# Altium footprint library Modules.PcbLib: 6 footprints (part 5 of 6)
Each footprint in its own frame and in the unit in brackets; x right, y up, seen from the top. Pads: shape width x height; smd on the part's side, far side on the other; paste and mask are expansions set on the pad; w line width, h text height; cw(c..) or ccw(c..) is an arc to the next point about the centre after c.
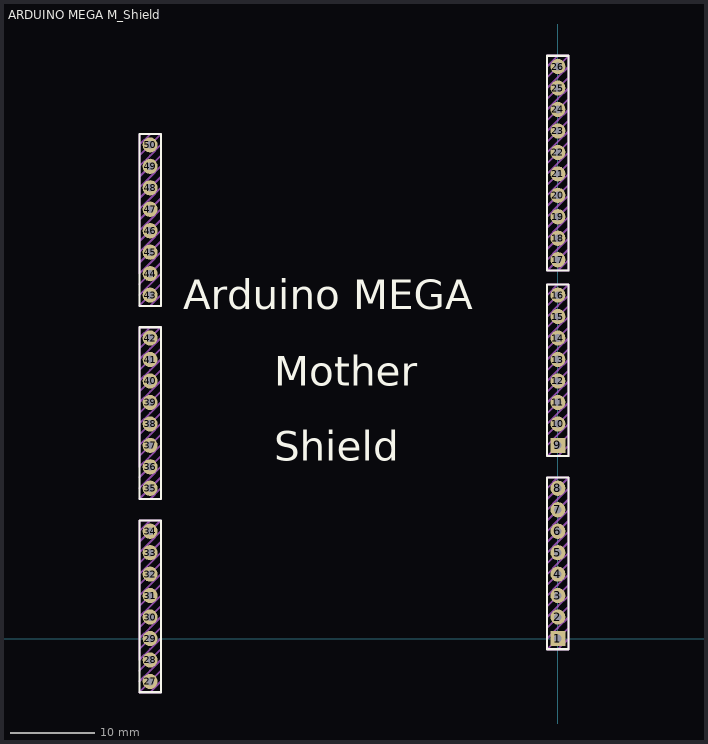
[diagram p4: the footprint, top view; thin cyan lines are the x and y axes]

## ARDUINO MEGA M_Shield [mm] "ARDUINO MEGA 2560 Full Mother Shield"
pads (50):
  rect 1.8x1.8 hole 0.9: 1(0,0) 9(0,22.86)
  round 1.8 hole 0.9: 2(0,2.54) 3(0,5.08) 4(0,7.62) 5(0,10.16) 6(0,12.7) 7(0,15.24) 8(0,17.78) 10(0,25.4) 11(0,27.94) 12(0,30.48) 13(0,33.02) 14(0,35.56) 15(0,38.1) 16(0,40.64) 17(0,44.831) 18(0,47.371) 19(0,49.911) 20(0,52.451) 21(0,54.991) 22(0,57.531) 23(0,60.071) 24(0,62.611) 25(0,65.151) 26(0,67.691) 27(-48.26,-5.08) 28(-48.26,-2.54) 29(-48.26,0) 30(-48.26,2.54) 31(-48.26,5.08) 32(-48.26,7.62) 33(-48.26,10.16) 34(-48.26,12.7) 35(-48.26,17.78) 36(-48.26,20.32) 37(-48.26,22.86) 38(-48.26,25.4) 39(-48.26,27.94) 40(-48.26,30.48) 41(-48.26,33.02) 42(-48.26,35.56) 43(-48.26,40.64) 44(-48.26,43.18) 45(-48.26,45.72) 46(-48.26,48.26) 47(-48.26,50.8) 48(-48.26,53.34) 49(-48.26,55.88) 50(-48.26,58.42)
Top Overlay:
  drawing of 313 lines, arcs and shapes, not listed
  text "Mother" at -33.59,29.91 h3.5
  text "Shield" at -33.59,21.02 h3.5
  text "Arduino MEGA" at -44.323,38.989 h3.5
Draw:
  drawing of 261 lines, arcs and shapes, not listed
3D body: height 8, standoff 0, extent -1.27,46.101 -0.991,48.641
3D body: height 8, standoff 0, extent -1.27,48.641 -0.991,51.181
3D body: height 8, standoff 0, extent -1.27,43.561 -0.991,46.101
3D body: height 8, standoff 0, extent -1.27,51.181 -0.991,53.721
3D body: height 8, standoff 0, extent -1.27,53.721 -0.991,56.261
3D body: height 8, standoff 7.5, extent -1.008,43.815 -0.508,45.847
3D body: height 8, standoff 7.5, extent -1.008,48.895 -0.508,50.927
3D body: height 8, standoff 7.5, extent -1.008,46.355 -0.508,48.387
3D body: height 8, standoff 7.5, extent -1.008,51.435 -0.508,53.467
3D body: height 8, standoff 7.5, extent -1.008,53.975 -0.508,56.007
3D body: height 7.5, standoff 0, extent -0.533,44.298 -0.508,45.365
3D body: height 7.5, standoff 0, extent -0.533,49.378 -0.508,50.445
3D body: height 7.5, standoff 0, extent -0.533,46.838 -0.508,47.905
3D body: height 7.5, standoff 0, extent -0.533,51.918 -0.508,52.985
3D body: height 7, standoff 0, extent -0.534,49.378 -0.483,50.445
3D body: height 7, standoff 0, extent -0.534,44.298 -0.483,45.365
3D body: height 7, standoff 0, extent -0.534,54.458 -0.483,55.525
3D body: height 7, standoff 0, extent -0.534,46.838 -0.483,47.905
3D body: height 7, standoff 0, extent -0.534,51.918 -0.483,52.985
3D body: height 7, standoff 0, extent -0.534,45.314 0.533,45.365
3D body: height 7, standoff 0, extent -0.534,50.394 0.533,50.445
3D body: height 7, standoff 0, extent -0.534,47.854 0.533,47.905
3D body: height 7, standoff 0, extent -0.534,52.934 0.533,52.985
3D body: height 7, standoff 0, extent -0.534,49.378 0.533,49.429
3D body: height 7, standoff 0, extent -0.534,44.298 0.533,44.349
3D body: height 7, standoff 0, extent -0.534,46.838 0.533,46.889
3D body: height 7, standoff 0, extent -0.534,51.918 0.533,51.969
3D body: height 7, standoff 0, extent -0.534,54.458 0.533,54.509
3D body: height 8, standoff 0, extent -1.27,56.261 -0.991,58.801
3D body: height 8, standoff 0, extent -1.27,58.801 -0.991,61.341
3D body: height 8, standoff 0, extent -1.27,61.341 -0.991,63.881
3D body: height 8, standoff 0, extent -1.27,63.881 -0.991,66.421
3D body: height 8, standoff 0, extent -1.27,66.421 -0.991,68.961
3D body: height 8, standoff 7.5, extent -1.008,56.515 -0.508,58.547
3D body: height 8, standoff 7.5, extent -1.008,61.595 -0.508,63.627
3D body: height 8, standoff 7.5, extent -1.008,64.135 -0.508,66.167
3D body: height 8, standoff 7.5, extent -1.008,59.055 -0.508,61.087
3D body: height 8, standoff 7.5, extent -1.008,66.675 -0.508,68.707
3D body: height 7.5, standoff 0, extent -0.533,54.458 -0.508,55.525
3D body: height 7.5, standoff 0, extent -0.533,59.538 -0.508,60.605
3D body: height 7.5, standoff 0, extent -0.533,56.998 -0.508,58.065
3D body: height 7.5, standoff 0, extent -0.533,62.078 -0.508,63.145
3D body: height 7.5, standoff 0, extent -0.533,64.618 -0.508,65.685
3D body: height 7.5, standoff 0, extent -0.533,67.158 -0.508,68.225
3D body: height 7, standoff 0, extent -0.534,59.538 -0.483,60.605
3D body: height 7, standoff 0, extent -0.534,56.998 -0.483,58.065
3D body: height 7, standoff 0, extent -0.534,64.618 -0.483,65.685
3D body: height 7, standoff 0, extent -0.534,62.078 -0.483,63.145
3D body: height 7, standoff 0, extent -0.534,67.158 -0.483,68.225
3D body: height 7, standoff 0, extent -0.534,55.474 0.533,55.525
3D body: height 7, standoff 0, extent -0.534,60.554 0.533,60.605
3D body: height 7, standoff 0, extent -0.534,58.014 0.533,58.065
3D body: height 7, standoff 0, extent -0.534,63.094 0.533,63.145
3D body: height 7, standoff 0, extent -0.534,65.634 0.533,65.685
3D body: height 7, standoff 0, extent -0.534,68.174 0.533,68.225
3D body: height 7, standoff 0, extent -0.534,56.998 0.533,57.049
3D body: height 7, standoff 0, extent -0.534,59.538 0.533,59.589
3D body: height 7, standoff 0, extent -0.534,62.078 0.533,62.129
3D body: height 7, standoff 0, extent -0.534,64.618 0.533,64.669
3D body: height 7, standoff 0, extent -0.534,67.158 0.533,67.209
3D body: height 1, standoff 0, extent -0.635,49.276 0.635,50.546
3D body: height 0, standoff -2.03, extent -0.127,49.657 0.127,50.165
3D body: height 0, standoff -2.03, extent -0.127,47.117 0.127,47.625
3D body: height 1, standoff 0, extent -0.635,46.736 0.635,48.006
3D body: height 0, standoff -2.03, extent -0.127,44.577 0.127,45.085
3D body: height 1, standoff 0, extent -0.635,44.196 0.635,45.466
3D body: height 0, standoff -2.03, extent -0.127,52.197 0.127,52.705
3D body: height 1, standoff 0, extent -0.635,51.816 0.635,53.086
3D body: height 1, standoff 0, extent -0.635,54.356 0.635,55.626
3D body: height 0, standoff -2.03, extent -0.127,54.737 0.127,55.245
3D body: height 7.5, standoff 0, extent -0.533,44.298 0.533,44.323
3D body: height 7.5, standoff 0, extent -0.533,49.378 0.533,49.403
3D body: height 7.5, standoff 0, extent -0.533,54.458 0.533,54.483
3D body: height 7.5, standoff 0, extent -0.533,46.838 0.533,46.863
3D body: height 8, standoff 7.5, extent -0.991,43.823 1.041,44.323
3D body: height 7, standoff 0, extent 0.482,44.298 0.533,45.365
3D body: height 7.5, standoff 0, extent -0.533,45.339 0.533,45.365
3D body: height 7.5, standoff 0, extent 0.508,44.298 0.533,45.365
3D body: height 8, standoff 0, extent 0.991,43.561 1.27,46.101
3D body: height 8, standoff 7.5, extent 0.508,43.815 1.008,45.847
3D body: height 8, standoff 7.5, extent -0.991,46.363 1.041,46.863
3D body: height 7, standoff 0, extent 0.482,46.838 0.533,47.905
3D body: height 7.5, standoff 0, extent 0.508,46.838 0.533,47.905
3D body: height 7.5, standoff 0, extent -0.533,47.879 0.533,47.905
3D body: height 8, standoff 7.5, extent -0.991,48.903 1.041,49.403
3D body: height 7, standoff 0, extent 0.482,49.378 0.533,50.445
3D body: height 7.5, standoff 0, extent -0.533,50.419 0.533,50.445
3D body: height 8, standoff 7.5, extent -0.991,51.443 1.041,51.943
3D body: height 7, standoff 0, extent 0.482,51.918 0.533,52.985
3D body: height 7.5, standoff 0, extent 0.508,51.918 0.533,52.985
3D body: height 7.5, standoff 0, extent -0.533,52.959 0.533,52.985
3D body: height 8, standoff 7.5, extent -0.991,53.983 1.041,54.483
3D body: height 7, standoff 0, extent 0.482,54.458 0.533,55.525
3D body: height 7.5, standoff 0, extent -0.533,55.499 0.533,55.525
3D body: height 8, standoff 7.5, extent -0.991,56.523 1.041,57.023
3D body: height 7, standoff 0, extent 0.482,56.998 0.533,58.065
3D body: height 7.5, standoff 0, extent -0.533,58.039 0.533,58.065
3D body: height 8, standoff 7.5, extent -0.991,59.063 1.041,59.563
3D body: height 7, standoff 0, extent 0.482,59.538 0.533,60.605
3D body: height 7.5, standoff 0, extent 0.508,59.538 0.533,60.605
3D body: height 7.5, standoff 0, extent -0.533,60.579 0.533,60.605
3D body: height 8, standoff 7.5, extent -0.991,61.603 1.041,62.103
3D body: height 7, standoff 0, extent 0.482,62.078 0.533,63.145
3D body: height 7.5, standoff 0, extent 0.508,62.078 0.533,63.145
3D body: height 7.5, standoff 0, extent -0.533,63.119 0.533,63.145
3D body: height 8, standoff 7.5, extent -0.991,64.143 1.041,64.643
3D body: height 7, standoff 0, extent 0.482,64.618 0.533,65.685
3D body: height 7.5, standoff 0, extent -0.533,65.659 0.533,65.685
3D body: height 8, standoff 7.5, extent -0.991,66.683 1.041,67.183
3D body: height 7, standoff 0, extent 0.482,67.158 0.533,68.225
3D body: height 7.5, standoff 0, extent 0.508,67.158 0.533,68.225
3D body: height 7.5, standoff 0, extent -0.533,68.199 0.533,68.225
3D body: height 8, standoff 0, extent 0.991,46.101 1.27,48.641
3D body: height 8, standoff 7.5, extent 0.508,46.355 1.008,48.387
3D body: height 7.5, standoff 0, extent 0.508,49.378 0.533,50.445
3D body: height 8, standoff 0, extent 0.991,48.641 1.27,51.181
3D body: height 8, standoff 7.5, extent 0.508,48.895 1.008,50.927
3D body: height 8, standoff 0, extent 0.991,51.181 1.27,53.721
3D body: height 8, standoff 7.5, extent 0.508,51.435 1.008,53.467
3D body: height 7.5, standoff 0, extent 0.508,54.458 0.533,55.525
3D body: height 8, standoff 0, extent 0.991,53.721 1.27,56.261
3D body: height 8, standoff 7.5, extent 0.508,53.975 1.008,56.007
3D body: height 7.5, standoff 0, extent 0.508,56.998 0.533,58.065
3D body: height 8, standoff 0, extent 0.991,56.261 1.27,58.801
3D body: height 8, standoff 7.5, extent 0.508,56.515 1.008,58.547
3D body: height 8, standoff 0, extent 0.991,58.801 1.27,61.341
3D body: height 8, standoff 7.5, extent 0.508,59.055 1.008,61.087
3D body: height 8, standoff 0, extent 0.991,61.341 1.27,63.881
3D body: height 8, standoff 7.5, extent 0.508,61.595 1.008,63.627
3D body: height 7.5, standoff 0, extent 0.508,64.618 0.533,65.685
3D body: height 8, standoff 0, extent 0.991,63.881 1.27,66.421
3D body: height 8, standoff 7.5, extent 0.508,64.135 1.008,66.167
3D body: height 8, standoff 0, extent 0.991,66.421 1.27,68.961
3D body: height 8, standoff 7.5, extent 0.508,66.675 1.008,68.707
3D body: height 0, standoff -2.03, extent -0.127,57.277 0.127,57.785
3D body: height 1, standoff 0, extent -0.635,56.896 0.635,58.166
3D body: height 1, standoff 0, extent -0.635,59.436 0.635,60.706
3D body: height 0, standoff -2.03, extent -0.127,59.817 0.127,60.325
3D body: height 0, standoff -2.03, extent -0.127,67.437 0.127,67.945
3D body: height 1, standoff 0, extent -0.635,67.056 0.635,68.326
3D body: height 0, standoff -2.03, extent -0.127,64.897 0.127,65.405
3D body: height 0, standoff -2.03, extent -0.127,62.357 0.127,62.865
3D body: height 1, standoff 0, extent -0.635,61.976 0.635,63.246
3D body: height 1, standoff 0, extent -0.635,64.516 0.635,65.786
3D body: height 7.5, standoff 0, extent -0.533,59.538 0.533,59.563
3D body: height 8, standoff 7.5, extent -1.016,55.499 1.016,56
3D body: height 7.5, standoff 0, extent -0.533,56.998 0.533,57.023
3D body: height 8, standoff 7.5, extent -1.016,58.039 1.016,58.54
3D body: height 8, standoff 7.5, extent -1.016,65.659 1.016,66.16
3D body: height 8, standoff 7.5, extent -1.016,68.199 1.016,68.7
3D body: height 8, standoff 7.5, extent -1.016,50.419 1.016,50.92
3D body: height 8, standoff 7.5, extent -1.016,45.339 1.016,45.84
3D body: height 8, standoff 7.5, extent -1.016,47.879 1.016,48.38
3D body: height 7.5, standoff 0, extent -0.533,51.918 0.533,51.943
3D body: height 8, standoff 7.5, extent -1.016,52.959 1.016,53.46
3D body: height 8, standoff 0, extent -1.27,43.561 1.27,43.841
3D body: height 8, standoff 0, extent -1.27,46.101 1.27,46.381
3D body: height 8, standoff 0, extent -1.27,45.822 1.27,46.101
3D body: height 8, standoff 0, extent -1.27,48.641 1.27,48.921
3D body: height 8, standoff 0, extent -1.27,50.902 1.27,51.181
3D body: height 8, standoff 0, extent -1.27,48.362 1.27,48.641
3D body: height 8, standoff 0, extent -1.27,51.181 1.27,51.461
3D body: height 8, standoff 0, extent -1.27,53.442 1.27,53.721
3D body: height 8, standoff 0, extent -1.27,53.721 1.27,54.001
3D body: height 7.5, standoff 0, extent -0.533,67.158 0.533,67.183
3D body: height 8, standoff 7.5, extent -1.016,63.119 1.016,63.62
3D body: height 7.5, standoff 0, extent -0.533,62.078 0.533,62.103
3D body: height 8, standoff 7.5, extent -1.016,60.579 1.016,61.08
3D body: height 7.5, standoff 0, extent -0.533,64.618 0.533,64.643
3D body: height 8, standoff 0, extent -1.27,55.982 1.27,56.261
3D body: height 8, standoff 0, extent -1.27,56.261 1.27,56.541
3D body: height 8, standoff 0, extent -1.27,58.522 1.27,58.801
3D body: height 8, standoff 0, extent -1.27,58.801 1.27,59.081
3D body: height 8, standoff 0, extent -1.27,61.341 1.27,61.621
3D body: height 8, standoff 0, extent -1.27,63.881 1.27,64.161
3D body: height 8, standoff 0, extent -1.27,66.142 1.27,66.421
3D body: height 8, standoff 0, extent -1.27,61.062 1.27,61.341
3D body: height 8, standoff 0, extent -1.27,68.682 1.27,68.961
3D body: height 8, standoff 0, extent -1.27,66.421 1.27,66.701
3D body: height 8, standoff 0, extent -1.27,63.602 1.27,63.881
3D body: height 7.5, standoff 0, extent -48.793,57.887 -47.727,57.912
3D body: height 8, standoff 0, extent -47.269,57.15 -46.99,59.69
3D body: height 8, standoff 0, extent -49.53,59.411 -46.99,59.69
3D body: height 0, standoff -2.03, extent -48.387,58.166 -48.133,58.674
3D body: height 8, standoff 0, extent -49.53,57.15 -46.99,57.43
3D body: height 7, standoff 0, extent -48.794,57.887 -47.727,57.938
3D body: height 7, standoff 0, extent -47.778,57.887 -47.727,58.954
3D body: height 7, standoff 0, extent -48.794,58.903 -47.727,58.954
3D body: height 7, standoff 0, extent -48.794,57.887 -48.743,58.954
3D body: height 1, standoff 0, extent -48.895,57.785 -47.625,59.055
3D body: height 8, standoff 0, extent -49.53,57.15 -49.251,59.69
3D body: height 8, standoff 7.5, extent -49.251,57.412 -47.219,57.912
3D body: height 8, standoff 7.5, extent -49.268,57.404 -48.768,59.436
3D body: height 8, standoff 7.5, extent -49.276,58.928 -47.244,59.429
3D body: height 8, standoff 7.5, extent -47.752,57.404 -47.252,59.436
3D body: height 7.5, standoff 0, extent -47.752,57.887 -47.727,58.954
3D body: height 7.5, standoff 0, extent -48.793,57.887 -48.768,58.954
3D body: height 7.5, standoff 0, extent -48.793,58.928 -47.727,58.954
3D body: height 7.5, standoff 0, extent -48.793,55.347 -47.727,55.372
3D body: height 8, standoff 0, extent -47.269,54.61 -46.99,57.15
3D body: height 8, standoff 0, extent -49.53,56.871 -46.99,57.15
3D body: height 0, standoff -2.03, extent -48.387,55.626 -48.133,56.134
3D body: height 8, standoff 0, extent -49.53,54.61 -46.99,54.89
3D body: height 7, standoff 0, extent -48.794,55.347 -47.727,55.398
3D body: height 7, standoff 0, extent -47.778,55.347 -47.727,56.414
3D body: height 7, standoff 0, extent -48.794,56.363 -47.727,56.414
3D body: height 7, standoff 0, extent -48.794,55.347 -48.743,56.414
3D body: height 1, standoff 0, extent -48.895,55.245 -47.625,56.515
3D body: height 8, standoff 0, extent -49.53,54.61 -49.251,57.15
3D body: height 8, standoff 7.5, extent -49.251,54.872 -47.219,55.372
3D body: height 8, standoff 7.5, extent -49.268,54.864 -48.768,56.896
3D body: height 8, standoff 7.5, extent -49.276,56.388 -47.244,56.889
3D body: height 8, standoff 7.5, extent -47.752,54.864 -47.252,56.896
3D body: height 7.5, standoff 0, extent -47.752,55.347 -47.727,56.414
3D body: height 7.5, standoff 0, extent -48.793,55.347 -48.768,56.414
3D body: height 7.5, standoff 0, extent -48.793,56.388 -47.727,56.414
3D body: height 7.5, standoff 0, extent -48.793,52.807 -47.727,52.832
3D body: height 8, standoff 0, extent -47.269,52.07 -46.99,54.61
3D body: height 8, standoff 0, extent -49.53,54.331 -46.99,54.61
3D body: height 0, standoff -2.03, extent -48.387,53.086 -48.133,53.594
3D body: height 8, standoff 0, extent -49.53,52.07 -46.99,52.35
3D body: height 7, standoff 0, extent -48.794,52.807 -47.727,52.858
3D body: height 7, standoff 0, extent -47.778,52.807 -47.727,53.874
3D body: height 7, standoff 0, extent -48.794,53.823 -47.727,53.874
3D body: height 7, standoff 0, extent -48.794,52.807 -48.743,53.874
3D body: height 1, standoff 0, extent -48.895,52.705 -47.625,53.975
3D body: height 8, standoff 0, extent -49.53,52.07 -49.251,54.61
3D body: height 8, standoff 7.5, extent -49.251,52.332 -47.219,52.832
3D body: height 8, standoff 7.5, extent -49.268,52.324 -48.768,54.356
3D body: height 8, standoff 7.5, extent -49.276,53.848 -47.244,54.349
3D body: height 8, standoff 7.5, extent -47.752,52.324 -47.252,54.356
3D body: height 7.5, standoff 0, extent -47.752,52.807 -47.727,53.874
3D body: height 7.5, standoff 0, extent -48.793,52.807 -48.768,53.874
3D body: height 7.5, standoff 0, extent -48.793,53.848 -47.727,53.874
3D body: height 7.5, standoff 0, extent -48.793,50.267 -47.727,50.292
3D body: height 8, standoff 0, extent -47.269,49.53 -46.99,52.07
3D body: height 8, standoff 0, extent -49.53,51.791 -46.99,52.07
3D body: height 0, standoff -2.03, extent -48.387,50.546 -48.133,51.054
3D body: height 8, standoff 0, extent -49.53,49.53 -46.99,49.81
3D body: height 7, standoff 0, extent -48.794,50.267 -47.727,50.318
3D body: height 7, standoff 0, extent -47.778,50.267 -47.727,51.334
3D body: height 7, standoff 0, extent -48.794,51.283 -47.727,51.334
3D body: height 7, standoff 0, extent -48.794,50.267 -48.743,51.334
3D body: height 1, standoff 0, extent -48.895,50.165 -47.625,51.435
3D body: height 8, standoff 0, extent -49.53,49.53 -49.251,52.07
3D body: height 8, standoff 7.5, extent -49.251,49.792 -47.219,50.292
3D body: height 8, standoff 7.5, extent -49.268,49.784 -48.768,51.816
3D body: height 8, standoff 7.5, extent -49.276,51.308 -47.244,51.809
3D body: height 8, standoff 7.5, extent -47.752,49.784 -47.252,51.816
3D body: height 7.5, standoff 0, extent -47.752,50.267 -47.727,51.334
3D body: height 7.5, standoff 0, extent -48.793,50.267 -48.768,51.334
3D body: height 7.5, standoff 0, extent -48.793,51.308 -47.727,51.334
3D body: height 7.5, standoff 0, extent -48.793,47.727 -47.727,47.752
3D body: height 8, standoff 0, extent -47.269,46.99 -46.99,49.53
3D body: height 8, standoff 0, extent -49.53,49.251 -46.99,49.53
3D body: height 0, standoff -2.03, extent -48.387,48.006 -48.133,48.514
3D body: height 8, standoff 0, extent -49.53,46.99 -46.99,47.27
3D body: height 7, standoff 0, extent -48.794,47.727 -47.727,47.778
3D body: height 7, standoff 0, extent -47.778,47.727 -47.727,48.794
3D body: height 7, standoff 0, extent -48.794,48.743 -47.727,48.794
3D body: height 7, standoff 0, extent -48.794,47.727 -48.743,48.794
3D body: height 1, standoff 0, extent -48.895,47.625 -47.625,48.895
3D body: height 8, standoff 0, extent -49.53,46.99 -49.251,49.53
3D body: height 8, standoff 7.5, extent -49.251,47.252 -47.219,47.752
3D body: height 8, standoff 7.5, extent -49.268,47.244 -48.768,49.276
3D body: height 8, standoff 7.5, extent -49.276,48.768 -47.244,49.269
3D body: height 8, standoff 7.5, extent -47.752,47.244 -47.252,49.276
3D body: height 7.5, standoff 0, extent -47.752,47.727 -47.727,48.794
3D body: height 7.5, standoff 0, extent -48.793,47.727 -48.768,48.794
3D body: height 7.5, standoff 0, extent -48.793,48.768 -47.727,48.794
3D body: height 7.5, standoff 0, extent -48.793,45.187 -47.727,45.212
3D body: height 8, standoff 0, extent -47.269,44.45 -46.99,46.99
3D body: height 8, standoff 0, extent -49.53,46.711 -46.99,46.99
3D body: height 0, standoff -2.03, extent -48.387,45.466 -48.133,45.974
3D body: height 8, standoff 0, extent -49.53,44.45 -46.99,44.73
3D body: height 7, standoff 0, extent -48.794,45.187 -47.727,45.238
3D body: height 7, standoff 0, extent -47.778,45.187 -47.727,46.254
3D body: height 7, standoff 0, extent -48.794,46.203 -47.727,46.254
3D body: height 7, standoff 0, extent -48.794,45.187 -48.743,46.254
3D body: height 1, standoff 0, extent -48.895,45.085 -47.625,46.355
3D body: height 8, standoff 0, extent -49.53,44.45 -49.251,46.99
3D body: height 8, standoff 7.5, extent -49.251,44.712 -47.219,45.212
3D body: height 8, standoff 7.5, extent -49.268,44.704 -48.768,46.736
3D body: height 8, standoff 7.5, extent -49.276,46.228 -47.244,46.729
3D body: height 8, standoff 7.5, extent -47.752,44.704 -47.252,46.736
3D body: height 7.5, standoff 0, extent -47.752,45.187 -47.727,46.254
3D body: height 7.5, standoff 0, extent -48.793,45.187 -48.768,46.254
3D body: height 7.5, standoff 0, extent -48.793,46.228 -47.727,46.254
3D body: height 7.5, standoff 0, extent -48.793,42.647 -47.727,42.672
3D body: height 8, standoff 0, extent -47.269,41.91 -46.99,44.45
3D body: height 8, standoff 0, extent -49.53,44.171 -46.99,44.45
3D body: height 0, standoff -2.03, extent -48.387,42.926 -48.133,43.434
3D body: height 8, standoff 0, extent -49.53,41.91 -46.99,42.19
3D body: height 7, standoff 0, extent -48.794,42.647 -47.727,42.698
3D body: height 7, standoff 0, extent -47.778,42.647 -47.727,43.714
3D body: height 7, standoff 0, extent -48.794,43.663 -47.727,43.714
3D body: height 7, standoff 0, extent -48.794,42.647 -48.743,43.714
3D body: height 1, standoff 0, extent -48.895,42.545 -47.625,43.815
3D body: height 8, standoff 0, extent -49.53,41.91 -49.251,44.45
3D body: height 8, standoff 7.5, extent -49.251,42.172 -47.219,42.672
3D body: height 8, standoff 7.5, extent -49.268,42.164 -48.768,44.196
3D body: height 8, standoff 7.5, extent -49.276,43.688 -47.244,44.189
3D body: height 8, standoff 7.5, extent -47.752,42.164 -47.252,44.196
3D body: height 7.5, standoff 0, extent -47.752,42.647 -47.727,43.714
3D body: height 7.5, standoff 0, extent -48.793,42.647 -48.768,43.714
3D body: height 7.5, standoff 0, extent -48.793,43.688 -47.727,43.714
3D body: height 7.5, standoff 0, extent -48.793,40.107 -47.727,40.132
3D body: height 8, standoff 0, extent -47.269,39.37 -46.99,41.91
3D body: height 8, standoff 0, extent -49.53,41.631 -46.99,41.91
3D body: height 0, standoff -2.03, extent -48.387,40.386 -48.133,40.894
3D body: height 8, standoff 0, extent -49.53,39.37 -46.99,39.65
3D body: height 7, standoff 0, extent -48.794,40.107 -47.727,40.158
3D body: height 7, standoff 0, extent -47.778,40.107 -47.727,41.174
3D body: height 7, standoff 0, extent -48.794,41.123 -47.727,41.174
3D body: height 7, standoff 0, extent -48.794,40.107 -48.743,41.174
3D body: height 1, standoff 0, extent -48.895,40.005 -47.625,41.275
3D body: height 8, standoff 0, extent -49.53,39.37 -49.251,41.91
3D body: height 8, standoff 7.5, extent -49.251,39.632 -47.219,40.132
3D body: height 8, standoff 7.5, extent -49.268,39.624 -48.768,41.656
3D body: height 8, standoff 7.5, extent -49.276,41.148 -47.244,41.649
3D body: height 8, standoff 7.5, extent -47.752,39.624 -47.252,41.656
3D body: height 7.5, standoff 0, extent -47.752,40.107 -47.727,41.174
3D body: height 7.5, standoff 0, extent -48.793,40.107 -48.768,41.174
3D body: height 7.5, standoff 0, extent -48.793,41.148 -47.727,41.174
3D body: height 7.5, standoff 0, extent -48.793,35.027 -47.727,35.052
3D body: height 8, standoff 0, extent -47.269,34.29 -46.99,36.83
3D body: height 8, standoff 0, extent -49.53,36.551 -46.99,36.83
3D body: height 0, standoff -2.03, extent -48.387,35.306 -48.133,35.814
3D body: height 8, standoff 0, extent -49.53,34.29 -46.99,34.57
3D body: height 7, standoff 0, extent -48.794,35.027 -47.727,35.078
3D body: height 7, standoff 0, extent -47.778,35.027 -47.727,36.094
3D body: height 7, standoff 0, extent -48.794,36.043 -47.727,36.094
3D body: height 7, standoff 0, extent -48.794,35.027 -48.743,36.094
3D body: height 1, standoff 0, extent -48.895,34.925 -47.625,36.195
3D body: height 8, standoff 0, extent -49.53,34.29 -49.251,36.83
3D body: height 8, standoff 7.5, extent -49.251,34.552 -47.219,35.052
3D body: height 8, standoff 7.5, extent -49.268,34.544 -48.768,36.576
3D body: height 8, standoff 7.5, extent -49.276,36.068 -47.244,36.569
3D body: height 8, standoff 7.5, extent -47.752,34.544 -47.252,36.576
3D body: height 7.5, standoff 0, extent -47.752,35.027 -47.727,36.094
3D body: height 7.5, standoff 0, extent -48.793,35.027 -48.768,36.094
3D body: height 7.5, standoff 0, extent -48.793,36.068 -47.727,36.094
3D body: height 7.5, standoff 0, extent -48.793,32.487 -47.727,32.512
3D body: height 8, standoff 0, extent -47.269,31.75 -46.99,34.29
3D body: height 8, standoff 0, extent -49.53,34.011 -46.99,34.29
3D body: height 0, standoff -2.03, extent -48.387,32.766 -48.133,33.274
3D body: height 8, standoff 0, extent -49.53,31.75 -46.99,32.03
3D body: height 7, standoff 0, extent -48.794,32.487 -47.727,32.538
3D body: height 7, standoff 0, extent -47.778,32.487 -47.727,33.554
3D body: height 7, standoff 0, extent -48.794,33.503 -47.727,33.554
3D body: height 7, standoff 0, extent -48.794,32.487 -48.743,33.554
3D body: height 1, standoff 0, extent -48.895,32.385 -47.625,33.655
3D body: height 8, standoff 0, extent -49.53,31.75 -49.251,34.29
3D body: height 8, standoff 7.5, extent -49.251,32.012 -47.219,32.512
3D body: height 8, standoff 7.5, extent -49.268,32.004 -48.768,34.036
3D body: height 8, standoff 7.5, extent -49.276,33.528 -47.244,34.029
3D body: height 8, standoff 7.5, extent -47.752,32.004 -47.252,34.036
3D body: height 7.5, standoff 0, extent -47.752,32.487 -47.727,33.554
3D body: height 7.5, standoff 0, extent -48.793,32.487 -48.768,33.554
3D body: height 7.5, standoff 0, extent -48.793,33.528 -47.727,33.554
3D body: height 7.5, standoff 0, extent -48.793,29.947 -47.727,29.972
3D body: height 8, standoff 0, extent -47.269,29.21 -46.99,31.75
3D body: height 8, standoff 0, extent -49.53,31.471 -46.99,31.75
3D body: height 0, standoff -2.03, extent -48.387,30.226 -48.133,30.734
3D body: height 8, standoff 0, extent -49.53,29.21 -46.99,29.49
3D body: height 7, standoff 0, extent -48.794,29.947 -47.727,29.998
3D body: height 7, standoff 0, extent -47.778,29.947 -47.727,31.014
3D body: height 7, standoff 0, extent -48.794,30.963 -47.727,31.014
3D body: height 7, standoff 0, extent -48.794,29.947 -48.743,31.014
3D body: height 1, standoff 0, extent -48.895,29.845 -47.625,31.115
3D body: height 8, standoff 0, extent -49.53,29.21 -49.251,31.75
3D body: height 8, standoff 7.5, extent -49.251,29.472 -47.219,29.972
3D body: height 8, standoff 7.5, extent -49.268,29.464 -48.768,31.496
3D body: height 8, standoff 7.5, extent -49.276,30.988 -47.244,31.489
3D body: height 8, standoff 7.5, extent -47.752,29.464 -47.252,31.496
3D body: height 7.5, standoff 0, extent -47.752,29.947 -47.727,31.014
3D body: height 7.5, standoff 0, extent -48.793,29.947 -48.768,31.014
3D body: height 7.5, standoff 0, extent -48.793,30.988 -47.727,31.014
3D body: height 7.5, standoff 0, extent -48.793,27.407 -47.727,27.432
3D body: height 8, standoff 0, extent -47.269,26.67 -46.99,29.21
3D body: height 8, standoff 0, extent -49.53,28.931 -46.99,29.21
3D body: height 0, standoff -2.03, extent -48.387,27.686 -48.133,28.194
3D body: height 8, standoff 0, extent -49.53,26.67 -46.99,26.95
3D body: height 7, standoff 0, extent -48.794,27.407 -47.727,27.458
3D body: height 7, standoff 0, extent -47.778,27.407 -47.727,28.474
3D body: height 7, standoff 0, extent -48.794,28.423 -47.727,28.474
3D body: height 7, standoff 0, extent -48.794,27.407 -48.743,28.474
3D body: height 1, standoff 0, extent -48.895,27.305 -47.625,28.575
3D body: height 8, standoff 0, extent -49.53,26.67 -49.251,29.21
3D body: height 8, standoff 7.5, extent -49.251,26.932 -47.219,27.432
3D body: height 8, standoff 7.5, extent -49.268,26.924 -48.768,28.956
3D body: height 8, standoff 7.5, extent -49.276,28.448 -47.244,28.949
3D body: height 8, standoff 7.5, extent -47.752,26.924 -47.252,28.956
3D body: height 7.5, standoff 0, extent -47.752,27.407 -47.727,28.474
3D body: height 7.5, standoff 0, extent -48.793,27.407 -48.768,28.474
3D body: height 7.5, standoff 0, extent -48.793,28.448 -47.727,28.474
3D body: height 7.5, standoff 0, extent -48.793,24.867 -47.727,24.892
3D body: height 8, standoff 0, extent -47.269,24.13 -46.99,26.67
3D body: height 8, standoff 0, extent -49.53,26.391 -46.99,26.67
3D body: height 0, standoff -2.03, extent -48.387,25.146 -48.133,25.654
3D body: height 8, standoff 0, extent -49.53,24.13 -46.99,24.41
3D body: height 7, standoff 0, extent -48.794,24.867 -47.727,24.918
3D body: height 7, standoff 0, extent -47.778,24.867 -47.727,25.934
3D body: height 7, standoff 0, extent -48.794,25.883 -47.727,25.934
3D body: height 7, standoff 0, extent -48.794,24.867 -48.743,25.934
3D body: height 1, standoff 0, extent -48.895,24.765 -47.625,26.035
3D body: height 8, standoff 0, extent -49.53,24.13 -49.251,26.67
3D body: height 8, standoff 7.5, extent -49.251,24.392 -47.219,24.892
3D body: height 8, standoff 7.5, extent -49.268,24.384 -48.768,26.416
3D body: height 8, standoff 7.5, extent -49.276,25.908 -47.244,26.409
3D body: height 8, standoff 7.5, extent -47.752,24.384 -47.252,26.416
3D body: height 7.5, standoff 0, extent -47.752,24.867 -47.727,25.934
3D body: height 7.5, standoff 0, extent -48.793,24.867 -48.768,25.934
3D body: height 7.5, standoff 0, extent -48.793,25.908 -47.727,25.934
3D body: height 7.5, standoff 0, extent -48.793,22.327 -47.727,22.352
3D body: height 8, standoff 0, extent -47.269,21.59 -46.99,24.13
3D body: height 8, standoff 0, extent -49.53,23.851 -46.99,24.13
3D body: height 0, standoff -2.03, extent -48.387,22.606 -48.133,23.114
3D body: height 8, standoff 0, extent -49.53,21.59 -46.99,21.87
3D body: height 7, standoff 0, extent -48.794,22.327 -47.727,22.378
3D body: height 7, standoff 0, extent -47.778,22.327 -47.727,23.394
3D body: height 7, standoff 0, extent -48.794,23.343 -47.727,23.394
3D body: height 7, standoff 0, extent -48.794,22.327 -48.743,23.394
3D body: height 1, standoff 0, extent -48.895,22.225 -47.625,23.495
3D body: height 8, standoff 0, extent -49.53,21.59 -49.251,24.13